# Altium footprint library Connectors.PCBLIB: 126 footprints (part 5 of 8)
Each footprint in its own frame and in the unit in brackets; x right, y up, seen from the top. Pads: shape width x height; smd on the part's side, far side on the other; paste and mask are expansions set on the pad; w line width, h text height; cw(c..) or ccw(c..) is an arc to the next point about the centre after c.
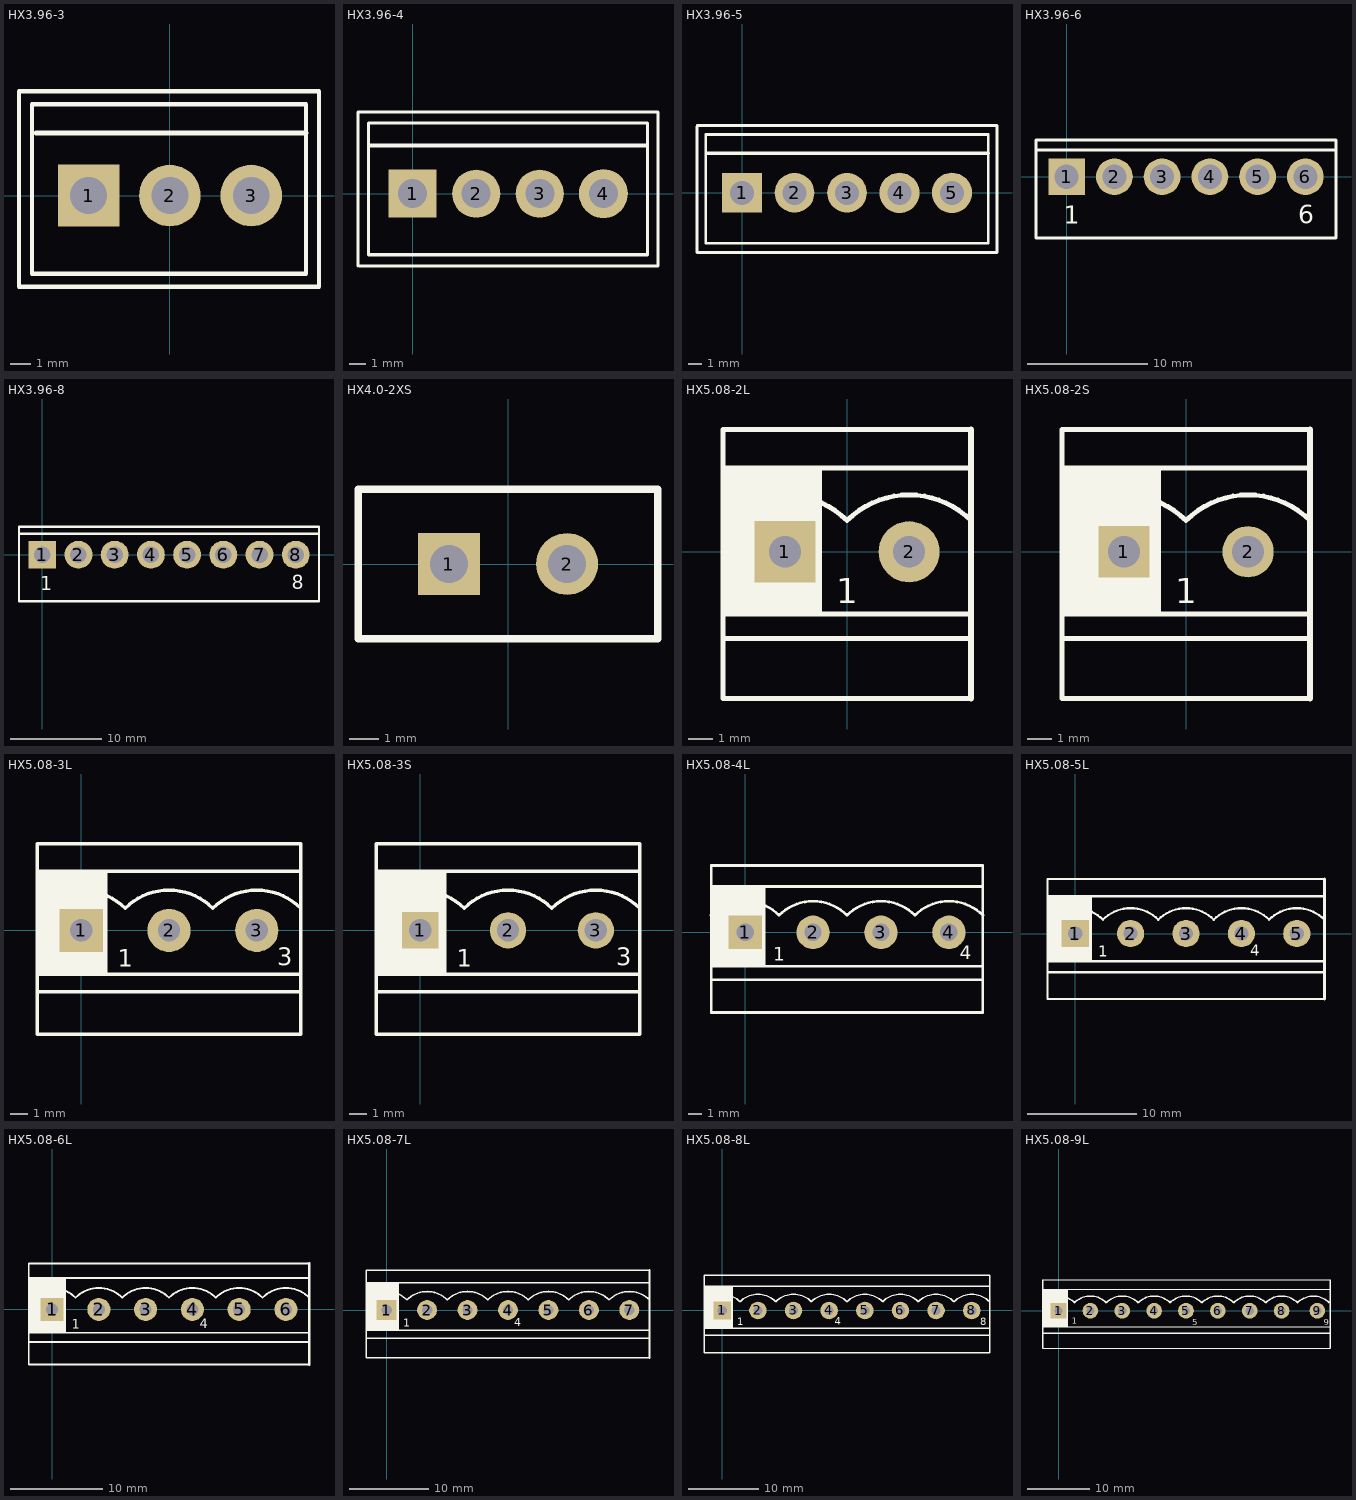
[diagram p4: the footprints below, top view; thin cyan lines are the x and y axes]

## HX3.96-3 [mm]
pads (3):
  rect 3x3 hole 1.8: 1(-3.96,0)
  round 3 hole 1.8: 2(0,0) 3(3.96,0)
Top Overlay:
  lines w0.203: -7.347,-4.445 -7.347,5.08 7.258,5.08 7.258,-4.445 -7.347,-4.445 ; -6.712,-3.81 -6.712,4.445 6.623,4.445 6.623,-3.81 -6.712,-3.81
  lines w0.254: -6.507,3.048 6.623,3.048

## HX3.96-4 [mm]
pads (4):
  rect 3x3 hole 1.8: 1(0,0)
  round 3 hole 1.8: 2(3.96,0) 3(7.92,0)
  round 3.048 hole 1.8: 4(11.88,0)
Top Overlay:
  lines w0.203: -3.4,-4.5 -3.4,5 ; -3.387,5.08 15.28,5.08 15.28,-4.445 ; -3.3,-4.5 15.28,-4.5 ; 14.6,-3.8 -2.75,-3.8 -2.75,4.4 14.6,4.4 ; 14.63,-3.8 14.63,4.4
  lines w0.254: -2.7,3 14.6,3

## HX3.96-5 [mm]
pads (5):
  rect 3x3 hole 1.8: 1(0,0)
  round 3 hole 1.8: 2(3.96,0) 3(7.92,0)
  round 3.048 hole 1.8: 4(11.88,0) 5(15.84,0)
Top Overlay:
  lines w0.203: -3.4,-4.5 -3.4,5 ; -3.387,5.08 19.24,5.08 19.24,-4.445 ; -3.3,-4.5 19.24,-4.5 ; -2.75,-3.8 -2.75,4.4 18.59,4.4 18.59,-3.8 -2.75,-3.8
  lines w0.254: -2.7,3 18.59,3

## HX3.96-6 [mil]
pads (6):
  rect 120x120 hole 78.74: 1(0,0)
  round 120 hole 78.74: 2(155.91,0) 3(311.81,0) 4(467.72,0) 5(623.62,0) 6(779.53,0)
Top Overlay:
  lines w10: -100,88 879.53,88 ; -100,-200 879.53,-200 879.53,120 -100,120 -100,-200
  text "1" at -10,-153 h60
  text "6" at 757,-152 h60

## HX3.96-8 [mil]
pads (8):
  rect 120x120 hole 70.87: 1(0,0)
  round 120 hole 70.87: 2(155.91,0) 3(311.81,0) 4(467.72,0) 5(623.62,0) 6(779.53,0) 7(935.43,0) 8(1091.34,0)
Top Overlay:
  lines w10: -100,90 1191.34,90 ; -100,-200 1191.34,-200 1191.34,120 -100,120 -100,-200
  text "8" at 1075,-149 h60
  text "1" at -9,-152 h60

## HX4.0-2XS [mm]
pads (2):
  rect 2.1x2.1 hole 1.3: 1(-2,0)
  round 2.1 hole 1.3: 2(2,0)
Top Overlay:
  lines w0.254: -5.08,-2.54 5.08,-2.54 5.08,2.54 -5.08,2.54 -5.08,-2.54

## HX5.08-2L [mm]
pads (2):
  rect 2.5x2.5 hole 1.3: 1(-2.54,0)
  round 2.5 hole 1.3: 2(2.54,0)
Top Overlay:
  rectangle: -5.08,-2.54 -1.016,3.429
  lines w0.203: -5.084,1.274 cw(c-2.54,-1.27) 0.004,1.274 ; -5.08,-3.556 5.08,-3.556 ; -5.08,-2.54 5.08,-2.54 ; -5.08,3.429 5.08,3.429 ; -0.004,1.274 cw(c2.54,-1.27) 5.084,1.274 ; 5.08,-6 -5.08,-6 -5.08,5 5.08,5
  lines w0.254: 5.08,-6 5.08,5
  text "1" at -0.432,-2.108 h1.02
3D body "050-2.step": height 11, standoff -2, extent -5.04,-5.5 4.96,2.5

## HX5.08-2S [mm]
pads (2):
  rect 2.1x2.1 hole 1.3: 1(-2.54,0)
  round 2.1 hole 1.3: 2(2.54,0)
Top Overlay:
  rectangle: -5.08,-2.54 -1.016,3.429
  lines w0.203: -5.084,1.274 cw(c-2.54,-1.27) 0.004,1.274 ; -5.08,-3.556 5.08,-3.556 ; -5.08,-2.54 5.08,-2.54 ; -5.08,3.429 5.08,3.429 ; -0.004,1.274 cw(c2.54,-1.27) 5.084,1.274 ; 5.08,-6 -5.08,-6 -5.08,5 5.08,5
  lines w0.254: 5.08,-6 5.08,5
  text "1" at -0.432,-2.108 h1.02
3D body "050-2.step": height 11, standoff -2, extent -5.04,-5.5 4.96,2.5

## HX5.08-3L [mm]
pads (3):
  rect 2.5x2.5 hole 1.3: 1(0,0)
  round 2.5 hole 1.3: 2(5.08,0) 3(10.16,0)
Top Overlay:
  rectangle: -2.54,-2.54 1.524,3.429
  lines w0.203: -2.544,1.274 cw(c0,-1.27) 2.544,1.274 ; -2.54,-3.556 12.7,-3.556 ; -2.54,-2.54 12.7,-2.54 ; -2.54,3.429 12.7,3.429 ; 2.536,1.274 cw(c5.08,-1.27) 7.624,1.274 ; 7.616,1.274 cw(c10.16,-1.27) 12.704,1.274 ; -2.54,-6 12.7,-6 12.7,5 -2.54,5 -2.54,-6
  text "3" at 11.328,-2.032 h1.02
  text "1" at 2.108,-2.108 h1.02
3D body "050-3.step": height 11, standoff -2, extent -2.5,-5.5 12.5,2.5

## HX5.08-3S [mm]
pads (3):
  rect 2.1x2.1 hole 1.3: 1(0,0)
  round 2.1 hole 1.3: 2(5.08,0) 3(10.16,0)
Top Overlay:
  rectangle: -2.54,-2.54 1.524,3.429
  lines w0.203: -2.544,1.274 cw(c0,-1.27) 2.544,1.274 ; -2.54,-3.556 12.7,-3.556 ; -2.54,-2.54 12.7,-2.54 ; -2.54,3.429 12.7,3.429 ; 2.536,1.274 cw(c5.08,-1.27) 7.624,1.274 ; 7.616,1.274 cw(c10.16,-1.27) 12.704,1.274 ; -2.54,-6 -2.54,5 12.7,5 12.7,-6 -2.54,-6
  text "1" at 2.108,-2.108 h1.02
  text "3" at 11.328,-2.032 h1.02
3D body "050-3.step": height 11, standoff -2, extent -2.5,-5.5 12.5,2.5

## HX5.08-4L [mm]
pads (4):
  rect 2.5x2.5 hole 1.3: 1(0,0)
  round 2.5 hole 1.3: 2(5.08,0) 3(10.16,0) 4(15.24,0)
Top Overlay:
  rectangle: -2.54,-2.54 1.524,3.429
  lines w0.203: -2.544,1.274 cw(c0,-1.27) 2.544,1.274 ; -2.54,-3.556 17.78,-3.556 ; -2.54,-2.54 17.78,-2.54 ; -2.54,3.429 17.78,3.429 ; 2.536,1.274 cw(c5.08,-1.27) 7.624,1.274 ; 7.616,1.274 cw(c10.16,-1.27) 12.704,1.274 ; 12.696,1.274 cw(c15.24,-1.27) 17.784,1.274 ; -2.54,-6 -2.54,5 17.78,5 17.78,-6 -2.54,-6
  text "1" at 2.108,-2.108 h1.02
  text "4" at 16.053,-2.032 h1.02
3D body "050-4.step": height 11, standoff -2, extent -2.5,-5.5 17.5,2.5

## HX5.08-5L [mm]
pads (5):
  rect 2.5x2.5 hole 1.3: 1(0,0)
  round 2.5 hole 1.3: 2(5.08,0) 3(10.16,0) 4(15.24,0) 5(20.32,0)
Top Overlay:
  rectangle: -2.54,-2.54 1.524,3.429
  lines w0.203: -2.544,1.274 cw(c0,-1.27) 2.544,1.274 ; -2.54,-3.556 22.86,-3.556 ; -2.54,-2.54 22.86,-2.54 ; -2.54,3.429 22.86,3.429 ; 2.536,1.274 cw(c5.08,-1.27) 7.624,1.274 ; 7.616,1.274 cw(c10.16,-1.27) 12.704,1.274 ; 12.696,1.274 cw(c15.24,-1.27) 17.784,1.274 ; 17.776,1.274 cw(c20.32,-1.27) 22.864,1.274 ; 22.86,-6 -2.54,-6 -2.54,5 22.86,5
  lines w0.254: 22.86,-6 22.86,5
  text "1" at 2.108,-2.108 h1.02
  text "4" at 16.053,-2.032 h1.02
3D body "050-5.step": height 11, standoff -2, extent -2.5,-5.5 22.5,2.5

## HX5.08-6L [mm]
pads (6):
  rect 2.5x2.5 hole 1.3: 1(0,0)
  round 2.5 hole 1.3: 2(5.08,0) 3(10.16,0) 4(15.24,0) 5(20.32,0) 6(25.4,0)
Top Overlay:
  rectangle: -2.54,-2.54 1.524,3.429
  lines w0.203: -2.544,1.274 cw(c0,-1.27) 2.544,1.274 ; -2.54,-3.556 27.94,-3.556 ; -2.54,-2.54 27.94,-2.54 ; -2.54,3.429 27.94,3.429 ; 2.536,1.274 cw(c5.08,-1.27) 7.624,1.274 ; 7.616,1.274 cw(c10.16,-1.27) 12.704,1.274 ; 12.696,1.274 cw(c15.24,-1.27) 17.784,1.274 ; 17.776,1.274 cw(c20.32,-1.27) 22.864,1.274 ; 22.856,1.274 cw(c25.4,-1.27) 27.944,1.274 ; 27.94,-6 -2.54,-6 -2.54,5 27.94,5
  lines w0.254: 27.94,-6 27.94,5
  text "4" at 16.053,-2.032 h1.02
  text "1" at 2.108,-2.108 h1.02
3D body "050-6.step": height 11, standoff -2, extent -2.5,-5.5 27.5,2.5

## HX5.08-7L [mm]
pads (7):
  rect 2.5x2.5 hole 1.3: 1(0,0)
  round 2.5 hole 1.3: 2(5.08,0) 3(10.16,0) 4(15.24,0) 5(20.32,0) 6(25.4,0) 7(30.48,0)
Top Overlay:
  rectangle: -2.54,-2.54 1.524,3.429
  lines w0.203: -2.544,1.274 cw(c0,-1.27) 2.544,1.274 ; -2.54,-3.556 33.02,-3.556 ; -2.54,-2.54 33.02,-2.54 ; -2.54,3.429 33.02,3.429 ; 2.536,1.274 cw(c5.08,-1.27) 7.624,1.274 ; 7.616,1.274 cw(c10.16,-1.27) 12.704,1.274 ; 12.696,1.274 cw(c15.24,-1.27) 17.784,1.274 ; 17.776,1.274 cw(c20.32,-1.27) 22.864,1.274 ; 22.856,1.274 cw(c25.4,-1.27) 27.944,1.274 ; 27.936,1.274 cw(c30.48,-1.27) 33.024,1.274 ; 33.02,-6 -2.54,-6 -2.54,5 33.02,5
  lines w0.254: 33.02,-6 33.02,5
  text "4" at 16.053,-2.032 h1.02
  text "1" at 2.108,-2.108 h1.02
3D body "050-7.step": height 11, standoff -2, extent -2.5,-5.5 32.5,2.5

## HX5.08-8L [mm]
pads (8):
  rect 2.5x2.5 hole 1.3: 1(0,0)
  round 2.5 hole 1.3: 2(5.08,0) 3(10.16,0) 4(15.24,0) 5(20.32,0) 6(25.4,0) 7(30.48,0) 8(35.56,0)
Top Overlay:
  rectangle: -2.54,-2.54 1.524,3.429
  lines w0.203: -2.544,1.274 cw(c0,-1.27) 2.544,1.274 ; -2.54,-3.556 38.1,-3.556 ; -2.54,-2.54 38.1,-2.54 ; -2.54,3.429 38.1,3.429 ; 2.536,1.274 cw(c5.08,-1.27) 7.624,1.274 ; 7.616,1.274 cw(c10.16,-1.27) 12.704,1.274 ; 12.696,1.274 cw(c15.24,-1.27) 17.784,1.274 ; 17.776,1.274 cw(c20.32,-1.27) 22.864,1.274 ; 22.856,1.274 cw(c25.4,-1.27) 27.944,1.274 ; 27.936,1.274 cw(c30.48,-1.27) 33.024,1.274 ; 33.016,1.274 cw(c35.56,-1.27) 38.104,1.274 ; -2.54,-6 -2.54,5 38.1,5 38.1,-6 -2.54,-6
  text "1" at 2.108,-2.108 h1.02
  text "4" at 16.053,-2.032 h1.02
  text "8" at 36.779,-2.083 h1.02
3D body "050-8.step": height 11, standoff -2, extent -2.5,-5.5 37.5,2.5

## HX5.08-9L [mm]
pads (9):
  rect 2.5x2.5 hole 1.3: 1(0,0)
  round 2.5 hole 1.3: 2(5.08,0) 3(10.16,0) 4(15.24,0) 5(20.32,0) 6(25.4,0) 7(30.48,0) 8(35.56,0) 9(41.275,0)
Top Overlay:
  rectangle: -2.54,-2.54 1.524,3.429
  lines w0.154: -2.54,-6 43.276,-6 43.307,-5.969 ; -2.54,-2.54 43.307,-2.54 ; -2.54,3.429 43.307,3.429 ; -2.54,4.953 43.307,4.953
  lines w0.203: -2.544,1.274 cw(c0,-1.27) 2.544,1.274 ; -2.54,-6 -2.54,4.953 ; -2.54,-3.556 43.307,-3.556 ; 2.536,1.274 cw(c5.08,-1.27) 7.624,1.274 ; 7.616,1.274 cw(c10.16,-1.27) 12.704,1.274 ; 12.696,1.274 cw(c15.24,-1.27) 17.784,1.274 ; 17.776,1.274 cw(c20.32,-1.27) 22.864,1.274 ; 22.856,1.274 cw(c25.4,-1.27) 27.944,1.274 ; 27.936,1.274 cw(c30.48,-1.27) 33.024,1.274 ; 33.016,1.274 cw(c35.56,-1.27) 38.104,1.274 ; 38.1,1.27 cw(c40.644,-1.274) 43.189,1.27 ; 43.307,-5.969 43.307,4.953
  text "9" at 42.291,-2.286 h1.02
  text "1" at 2.108,-2.108 h1.02
  text "5" at 21.336,-2.286 h1.02
3D body "050-9.STEP": height 11, standoff -2, extent -2.5,-5.5 42.5,2.5